# Altium footprint library SWARMUS_LIB.PcbLib: 114 footprints (part 3 of 8)
Each footprint in its own frame and in the unit in brackets; x right, y up, seen from the top. Pads: shape width x height; smd on the part's side, far side on the other; paste and mask are expansions set on the pad; w line width, h text height; cw(c..) or ccw(c..) is an arc to the next point about the centre after c.
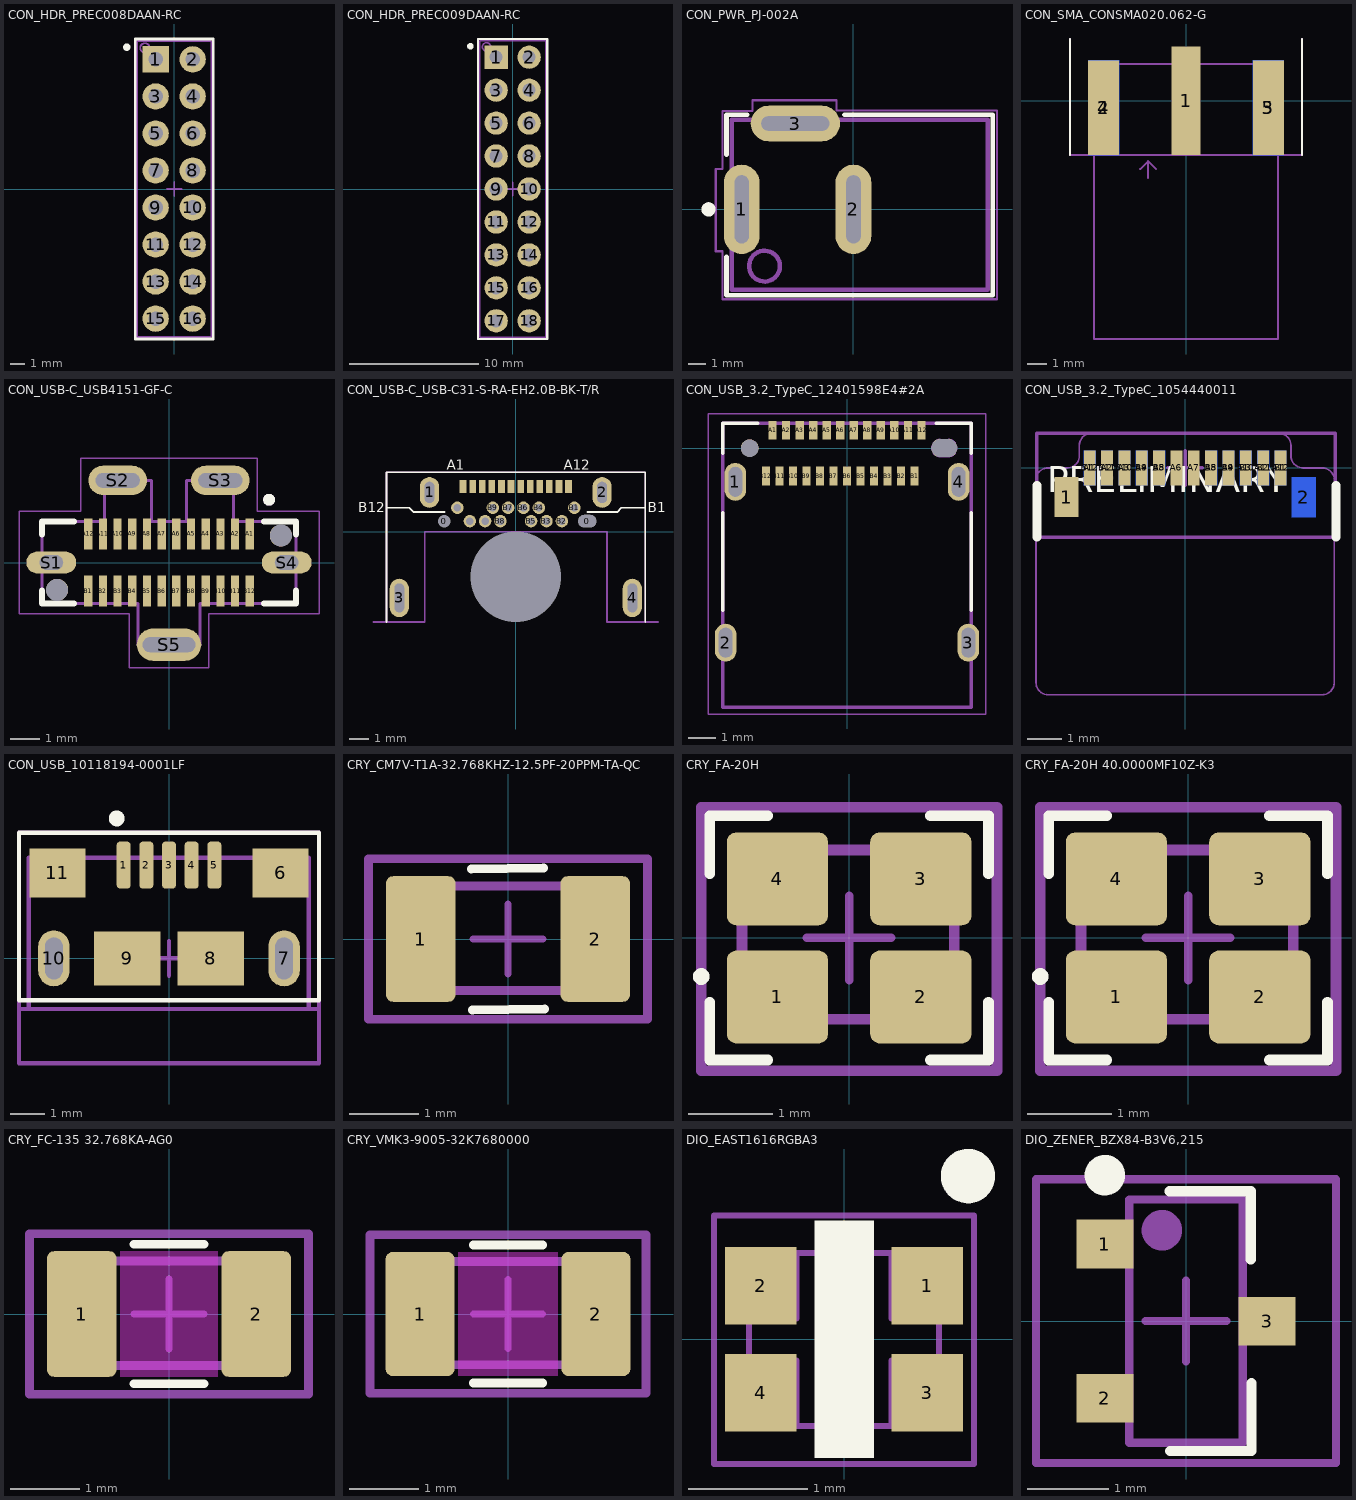
[diagram p2: the footprints below, top view; thin cyan lines are the x and y axes]

## CON_HDR_PREC008DAAN-RC [mm]
pads (16):
  rect 1.8x1.8 hole 1: 1(-1.27,8.89)
  round 1.8 hole 1: 2(1.27,8.89) 3(-1.27,6.35) 4(1.27,6.35) 5(-1.27,3.81) 6(1.27,3.81) 7(-1.27,1.27) 8(1.27,1.27) 9(-1.27,-1.27) 10(1.27,-1.27) 11(-1.27,-3.81) 12(1.27,-3.81) 13(-1.27,-6.35) 14(1.27,-6.35) 15(-1.27,-8.89) 16(1.27,-8.89)
Top Overlay:
  circle w0.25: c-3.251,9.728 r0.127
  lines w0.178: -2.667,-10.287 2.667,-10.287 2.667,10.287 -2.667,10.287 -2.667,-10.287
Top Assembly Drawing:
  circle w0.127: c-2.007,9.677 r0.322
  lines w0.127: -0.5,0 0.5,0 ; 0,-0.5 0,0.5 ; -2.54,-10.16 -2.54,10.16 2.54,10.16 2.54,-10.16 -2.54,-10.16
Top Courtyard:
  lines w0.127: -2.667,-10.287 -2.667,10.287 2.667,10.287 2.667,-10.287 -2.667,-10.287
3D body "PR(E,P)C008DAAN-RC.STEP": height 8.37, standoff -3, extent -2.54,-10.16 2.54,10.16

## CON_HDR_PREC009DAAN-RC [mm]
pads (18):
  rect 1.8x1.8 hole 1: 1(-1.27,10.16)
  round 1.8 hole 1: 2(1.27,10.16) 3(-1.27,7.62) 4(1.27,7.62) 5(-1.27,5.08) 6(1.27,5.08) 7(-1.27,2.54) 8(1.27,2.54) 9(-1.27,0) 10(1.27,0) 11(-1.27,-2.54) 12(1.27,-2.54) 13(-1.27,-5.08) 14(1.27,-5.08) 15(-1.27,-7.62) 16(1.27,-7.62) 17(-1.27,-10.16) 18(1.27,-10.16)
Top Overlay:
  circle w0.25: c-3.251,10.998 r0.127
  lines w0.178: -2.667,-11.557 -2.667,11.557 2.667,11.557 2.667,-11.557 -2.667,-11.557
Top Assembly Drawing:
  circle w0.127: c-2.007,10.947 r0.322
  lines w0.127: -0.5,0 0.5,0 ; 0,-0.5 0,0.5 ; -2.54,-11.43 2.54,-11.43 2.54,11.43 -2.54,11.43 -2.54,-11.43
Top Courtyard:
  lines w0.127: -2.667,-11.557 -2.667,11.557 2.667,11.557 2.667,-11.557 -2.667,-11.557
3D body "PREC009DAAN-RC.step": height 8.43, standoff -2.94, extent -2.54,-11.43 2.54,11.43

## CON_PWR_PJ-002A [mm]
pads (3):
  oval 2x5 hole 0.8 slot 3.8 at 90 deg mask+0.07: 1(-6.25,0) 2(0,0)
  oval 5x2 hole 0.8 slot 3.8 at 0 deg mask+0.07: 3(-3.25,4.8)
Top Overlay:
  circle w0.4: c-8.108,-0.002 r0.2
  lines w0.254: -7.1,-2.65 -7.1,-4.8 7.8,-4.8 7.8,5.3 -0.502,5.3 ; -7.1,3.043 -7.1,5.3 -5.929,5.3
Top Assembly Drawing:
  circle w0.254: c-4.975,-3.175 r0.862
  lines w0.254: -6.8,-4.5 -6.8,5 7.5,5 7.5,-4.5 -6.8,-4.5
Top Courtyard:
  lines w0.127: -0.9,0 0,0 ; 0,-0.9 0,0 ; 0,0.9 0,0 ; 0.9,0 0,0 ; -7.7,-2.35 -7.325,-2.35 -7.325,-5.025 8.025,-5.025 8.025,5.525 -0.95,5.525 -0.95,6.1 -5.65,6.1 -5.65,5.5 -7.325,5.5 -7.325,2.25 -7.7,2.25 -7.7,-2.35
3D body "54-00166.STEP": height 11.02, standoff -3.58, extent -6.8,-4.5 7.5,5

## CON_SMA_CONSMA020.062-G [mm] "EDGE SMA femal connector"
pads (5):
  rect 1.5x5.6 smd paste-25 mask+0.07: 1(0,0)
  rect 1.6x4.9 smd paste-25 mask+0.07: 2(-4.26,-0.35) 3(4.26,-0.35)
  rect 1.6x4.9 smd far side paste-25 mask+0.07: 4(-4.26,-0.35) 5(4.26,-0.35)
Top Overlay:
  lines w0.1: -6,-2.8 -6,3.2 ; 6,-2.8 6,3.2
Bottom Overlay:
  lines w0.1: -6,-2.8 -6,3.2 ; 6,-2.8 6,3.2
Top Assembly Drawing:
  lines w0.1: -2.37,-3.52 -1.959,-3.109 ; -1.959,-3.994 -1.959,-3.109 ; -1.548,-3.52 -1.959,-3.109 ; -4.76,-2.8 4.76,-2.8 ; -4.76,-2.8 -4.76,-12.3 4.76,-12.3 4.76,-2.8 ; -4.76,-2.8 -4.76,1.9 4.76,1.9 4.76,-2.8
  text "Board edge / 62 mils PCB" at -4.185,-6.655 h0.8
Top Courtyard:
  lines w0.1: -6,3.2 -6,-2.8 6,-2.8 6,3.2 ; -0.5,0 0.5,0 ; 0,-0.5 0,0.5
Bottom Courtyard:
  lines w0.1: -6,3.2 -6,-2.8 6,-2.8 6,3.2
3D body "CONSMA020.062-G--3DModel-STEP-56544.STEP": height 4.35, standoff -3.57, extent -4.76,-12.3 4.76,1.9

## CON_USB-C_USB4151-GF-C [mm] "USB-C plug Vertical"
pads (31):
  rect 0.28x1.05 smd mask+0.045: A1(2.75,0.975) A2(2.25,0.975) A3(1.75,0.975) A4(1.25,0.975) A5(0.75,0.975) A6(0.25,0.975) A7(-0.25,0.975) A8(-0.75,0.975) A9(-1.25,0.975) A10(-1.75,0.975) A11(-2.25,0.975) A12(-2.75,0.975) B1(-2.75,-0.975) B2(-2.25,-0.975) B3(-1.75,-0.975) B4(-1.25,-0.975) B5(-0.75,-0.975) B6(-0.25,-0.975) B7(0.25,-0.975) B8(0.75,-0.975) B9(1.25,-0.975) B10(1.75,-0.975) B11(2.25,-0.975) B12(2.75,-0.975)
  oval 1.7x0.75 hole 0.5 slot 0.8 at 0 deg mask+0.05: S1(-4.01,0) S4(4.01,0)
  oval 2x1 hole 0.5 slot 1.5 at 0 deg mask+0.05: S2(-1.75,2.8) S3(1.75,2.8)
  oval 2.2x1.1 hole 0.5 slot 1.8 at 0 deg mask+0.05: S5(0,-2.8)
  round 0.75 hole 0.75 unplated mask+0: ""(-3.81,-0.93) ""(3.81,0.92)
Top Overlay:
  circle w0.2: c3.41,2.14 r0.1
  lines w0.2: -4.33,-0.95 -4.33,-1.4 -3.24,-1.4 ; -4.33,0.95 -4.33,1.4 -3.24,1.4 ; 3.24,-1.4 4.33,-1.4 4.33,-0.95 ; 3.24,1.4 4.33,1.4 4.33,0.95
Top 3D Model:
  circle w0.2: c3.41,2.14 r0.1
  lines w0.1: -4.33,-1.4 -4.33,1.4 -2.2,1.4 -2.2,2.8 -0.6,2.8 -0.6,1.4 0.6,1.4 0.6,2.8 2.2,2.8 2.2,1.4 4.33,1.4 4.33,-1.4 1.05,-1.4 1.05,-2.8 -1.05,-2.8 -1.05,-1.4 -4.33,-1.4
Top Courtyard:
  lines w0.05: -5.11,-1.75 -5.11,1.75 -3,1.75 -3,3.55 3,3.55 3,1.75 5.11,1.75 5.11,-1.75 1.35,-1.75 1.35,-3.58 -1.35,-3.58 -1.35,-1.75 -5.11,-1.75
3D body "USB4151-GF-C--3DModel-STEP-56544.STEP": height 11.1, standoff -1.25, extent -4.33,-2.875 4.33,2.875

## CON_USB-C_USB-C31-S-RA-EH2.0B-BK-T/R [mm] "USB-C 24 pins"
pads (31):
  round 0.6 hole 0.65 unplated mask+0: 0(-3.725,0.55)
  rect 0.35x0.7 hole 4.7 square unplated: 0(0,-2.35)
  round 0.6 hole 0.65 slot 0.95 at 0 deg unplated mask+0: 0(3.725,0.55)
  oval 1x1.6 hole 1.1 slot 0.5 at 0 deg: 1(-4.5,2.05) 2(4.5,2.05)
  oval 1x2 hole 1.5 slot 0.5 at 0 deg: 3(-6.075,-3.45) 4(6.075,-3.45)
  rect 0.35x0.7 smd mask+0: A1(-2.75,2.36) A2(-2.25,2.36) A3(-1.75,2.36) A4(-1.25,2.36) A5(-0.75,2.36) A6(-0.25,2.36) A7(0.25,2.36) A8(0.75,2.36) A9(1.25,2.36) A10(1.75,2.36) A11(2.25,2.36) A12(2.75,2.36)
  round 0.65 hole 0.4 mask+0: B1(3.05,1.25) B2(2.4,0.55) B3(1.6,0.55) B4(1.2,1.25) B5(0.8,0.55) B6(0.4,1.25) B7(-0.4,1.25) B8(-0.8,0.55) B9(-1.2,1.25) B10(-1.6,0.55) B11(-2.4,0.55) B12(-3.05,1.25)
Top Overlay:
  lines w0.1: -6.75,-4.7 -6.75,3.1 6.75,3.1 6.75,-4.7 ; -6.75,1.25 -5.547,1.25 -5.324,1.027 -3.725,1.027 ; 3.725,1.027 5.282,1.027 5.505,1.25 6.75,1.25
  text "B1" at 6.886,1.013 h0.51
  text "B12" at -8.229,1.027 h0.51
  text "A12" at 2.502,3.227 h0.51
  text "A1" at -3.598,3.227 h0.51
Bottom Overlay:
  text "B12" at -2.73,1.807 h0.51
  text "B1" at 3.37,1.807 h0.51
Board Outline:
  lines w0.1: -7.414,-4.7 -4.75,-4.7 -4.75,0 4.75,0 4.75,-4.7 7.414,-4.7
  text "Board edge" at -7.16,-6.581 h1.52
Top Courtyard:
  lines w0.1: -6.75,-4.7 -6.75,3.1 6.75,3.1 6.75,-4.7
3D body "USB-C31-S-RA-EH2.0B-BK-TR.STEP": height 2, standoff -1.42, extent -6.175,-5.85 6.175,2.8

## CON_USB_3.2_TypeC_12401598E4#2A [mm]
pads (30):
  oval 0.8x1.4 hole 0.5 slot 1.1 at 90 deg paste+0 mask+0.07: 1(-4.13,-1.25) 2(-4.49,-7.2) 3(4.49,-7.2) 4(4.13,-1.25)
  rect 0.3x0.7 smd paste-0.025 mask+0.04: A1(-2.75,0.66) A2(-2.25,0.66) A3(-1.75,0.66) A4(-1.25,0.66) A5(-0.75,0.66) A6(-0.25,0.66) A7(0.25,0.66) A8(0.75,0.66) A9(1.25,0.66) A10(1.75,0.66) A11(2.25,0.66) A12(2.75,0.66) B1(2.5,-1.04) B2(2,-1.04) B3(1.5,-1.04) B4(1,-1.04) B5(0.5,-1.04) B6(0,-1.04) B7(-0.5,-1.04) B8(-1,-1.04) B9(-1.5,-1.04) B10(-2,-1.04) B11(-2.5,-1.04) B12(-3,-1.04)
  round 0.65 hole 0.65 unplated mask+0.07: ""(-3.6,0)
  oval 0.95x0.65 hole 0.65 slot 0.95 at 0 deg paste+0 mask+0.07: ""(3.6,0)
Top Overlay:
  lines w0.127: -4.6,-6 -4.6,-2.4 ; -4.6,-0.2 -4.6,0.91 -3.3,0.91 ; 3.3,0.91 4.6,0.91 4.6,-0.2 ; 4.6,-6 4.6,-2.4
Top Assembly Drawing:
  lines w0: 3.45,-0.325 cw(c3.45,0) 3.45,0.325 3.75,0.325 cw(c3.75,0) 3.75,-0.325 3.45,-0.325
  lines w0.127: -4.6,0.889 -4.6,-9.59 4.6,-9.59 4.6,0.91 -4.6,0.91
  text "A12" at 2.921,0.127 h0.51
  text "B1" at 3.048,-2.285 h0.51
  text "B12" at -4.17,-2.168 h0.51
  text "A1" at -4.064,0.127 h0.51
Top Courtyard:
  lines w0.05: -5.14,-9.84 5.14,-9.84 5.14,1.26 -5.14,1.26 -5.14,-9.84
3D body "12401598E4#2A--3DModel-STEP-56544.STEP": height 3.28, standoff -2.1, extent -4.6,-9.6 4.6,0.9

## CON_USB_3.2_TypeC_1054440011 [mm] "USB-C plug, sandwhich 0.8mm board"
pads (24):
  rect 0.7x1.15 smd: 1(-3.42,-0.84)
  rect 0.7x1.15 smd far side: 2(3.42,-0.84)
  rect 0.34x1 smd mask+0.02: A1(-2.75,0) A2(-2.25,0) A3(-1.75,0) A4(-1.25,0) A5(-0.75,0) A6(-0.25,0) A7(0.25,0) A8(0.75,0) A9(1.25,0) A10(1.75,0) A11(2.25,0) A12(2.75,0)
  rect 0.34x1 smd far side mask+0.02: B1(2.75,0) B2(2.25,0) B3(1.75,0) B4(1.25,0) B5(0.75,0) B8(-0.75,0) B9(-1.25,0) B10(-1.75,0) B11(-2.25,0) B12(-2.75,0)
Top Overlay:
  lines w0.254: -4.275,-2 -4.275,-0.5 ; 4.35,-2 4.35,-0.5
  text "PRELIMINARY" at -3.975,-0.7 h0.76
Top Assembly Drawing:
  lines w0.05: -4.3,-6.19 ccw(c-3.95,-6.19) -3.95,-6.54 3.95,-6.54 ccw(c3.95,-6.19) 4.3,-6.19 4.3,-0.35 ccw(c3.95,-0.35) 3.95,0 3.4,0 cw(c3.4,0.35) 3.05,0.35 3.05,0.65 ccw(c2.7,0.65) 2.7,1 -2.7,1 ccw(c-2.7,0.65) -3.05,0.65 -3.05,0.35 cw(c-3.4,0.35) -3.4,0 -3.95,0 ccw(c-3.95,-0.35) -4.3,-0.35 -4.3,-6.19
Top Courtyard:
  lines w0.1: -0.5,0 0.5,0 ; 0,-0.5 0,0.5 ; 4.325,-2 -4.275,-2 -4.275,1 4.325,1 4.325,-1.925
3D body "1054440011.stp": height 1.72, standoff -2.12, extent -4.59,-0.99 4.59,11.05

## CON_USB_10118194-0001LF [mm] "CONN USB MICRO B RECPT SMT R/A"
height 2.4
pads (11):
  rrect50% 0.4x1.35 smd paste-0.05 mask+0.05: 1(-1.3,2.675) 2(-0.65,2.675) 3(0,2.675) 4(0.65,2.675) 5(1.3,2.675)
  rect 1.6x1.4 smd paste-0.05 mask+0.05: 6(3.2,2.45) 11(-3.2,2.45)
  rrect100% 0.9x1.6 hole 0.5 slot 1.2 at 90 deg mask+0.05: 7(3.3,0) 10(-3.3,0)
  rect 1.9x1.55 smd paste-0.05 mask+0.05: 8(1.2,0) 9(-1.2,0)
Top Overlay:
  circle w0.254: c-1.499,4.013 r0.1
  lines w0.127: -4.3,-1.2 -4.3,3.6 4.3,3.6 4.3,2.55 4.3,0.05 4.3,-1.2 -4.3,-1.2
Top Assembly Drawing:
  lines w0.127: -4.3,-1.45 -4.025,-1.45 ; 4.025,-1.45 4.3,-1.45 ; -4.025,-1.45 -4.025,2.89 4,2.89 4,-1.45 -4,-1.45 -4.025,-1.45
  text "Board Edge" at -2.9,-2.4 h0.6
Top Courtyard:
  lines w0.127: -0.5,0 0,0 ; 0,-0.5 0,0 ; 0,0.5 0,0 ; 0.5,0 0,0 ; -4.3,-3 -4.3,3.6 4.3,3.6 4.3,-3 -4.3,-3
3D body "10118193-0001lfc.stp": height 2.88, standoff -0.72, extent -3.928,-2.76 3.929,2.9

## CRY_CM7V-T1A-32.768KHZ-12.5PF-20PPM-TA-QC [mm] "CRY - 32.768KHZ tol:20ppm 12.5PF - 2-SMD"
height 0.65
pads (2):
  rrect20% 1x1.8 smd paste-0.025 mask+0.07: 1(-1.25,0) 2(1.25,0)
Top Overlay:
  lines w0.127: -0.527,1.005 0.508,1.016 ; -0.508,-1.016 0.527,-1.005
Top Assembly Drawing:
  lines w0.127: -1.6,0.762 1.6,0.762 1.6,-0.738 ; -1.6,0.763 -1.6,-0.737 1.6,-0.737
Top Assembly:
  lines w0.1: -1.65,-0.8 -1.65,0.8 ; 1.65,-0.8 1.65,0.8
Top Courtyard:
  lines w0.1: -0.5,0 0.5,0 ; 0,-0.5 0,0.5
  lines w0.127: -2,-1.15 2,-1.15 2,1.15 -2,1.15 -2,-1.15 ; -2,-1.15 -2,-1.15
3D body: height 0.65, standoff 0, extent -0.6,-0.8 0.6,0.8
3D body: height 0.65, standoff 0, extent -1.65,-0.8 -0.6,0.8
3D body: height 0.65, standoff 0, extent 0.6,-0.8 1.65,0.8

## CRY_FA-20H [mm] "CRY - FA-20H 4-SMD"
height 0.55
pads (4):
  rrect20% 1.2x1.1 smd paste-0.025 mask+0.07: 1(-0.85,-0.7) 2(0.85,-0.7) 3(0.85,0.7) 4(-0.85,0.7)
Top Overlay:
  circle w0.1: c-1.753,-0.457 r0.05
  lines w0.127: -1.651,-0.762 -1.651,-1.448 -0.965,-1.448 ; -1.651,0.762 -1.651,1.448 -0.965,1.448 ; 0.965,-1.448 1.651,-1.448 1.651,-0.762 ; 0.965,1.448 1.651,1.448 1.651,0.762
Top Assembly Drawing:
  circle w0.254: c-0.85,-0.457 r0.036
  lines w0.127: -1.27,1.035 -1.27,-0.965 1.23,-0.965 ; -1.255,1.041 1.245,1.041 1.245,-0.959
Top Courtyard:
  lines w0.1: -0.5,0 0.5,0 ; 0,-0.5 0,0.5
  lines w0.127: -1.753,-1.575 -1.753,1.549 1.753,1.549 1.753,-1.575 -1.753,-1.575
3D body: height 0.55, standoff 0.05, extent -1.3,-1.05 1.3,1.05

## CRY_FA-20H 40.0000MF10Z-K3 [mm] "CRY - 40MKHZ 10ppm 10PF - 4-SMD"
height 0.55
pads (4):
  rrect20% 1.2x1.1 smd paste-0.025 mask+0.07: 1(-0.85,-0.7) 2(0.85,-0.7) 3(0.85,0.7) 4(-0.85,0.7)
Top Overlay:
  circle w0.1: c-1.753,-0.457 r0.05
  lines w0.127: -1.651,-0.762 -1.651,-1.448 -0.965,-1.448 ; -1.651,0.762 -1.651,1.448 -0.965,1.448 ; 0.965,-1.448 1.651,-1.448 1.651,-0.762 ; 0.965,1.448 1.651,1.448 1.651,0.762
Top Assembly Drawing:
  circle w0.254: c-0.85,-0.457 r0.036
  lines w0.127: -1.27,1.035 -1.27,-0.965 1.23,-0.965 ; -1.255,1.041 1.245,1.041 1.245,-0.959
Top Courtyard:
  lines w0.1: -0.5,0 0.5,0 ; 0,-0.5 0,0.5
  lines w0.127: -1.753,-1.575 -1.753,1.549 1.753,1.549 1.753,-1.575 -1.753,-1.575
3D body: height 0.55, standoff 0.05, extent -1.3,-1.05 1.3,1.05

## CRY_FC-135 32.768KA-AG0 [mm] "CRY - 32.768KHZ tol:20ppm 12.5PF - 2-SMD"
height 0.65
pads (2):
  rrect20% 1x1.8 smd paste-0.025 mask+0.07: 1(-1.25,0) 2(1.25,0)
Top Layer keep-out:
  rectangle: -0.7,-0.9 0.7,0.9
Top Overlay:
  lines w0.127: -0.5,-1 0.5,-1 ; -0.5,1 0.5,1
Top Assembly Drawing:
  lines w0.127: -1.6,0.762 1.6,0.762 1.6,-0.738 ; -1.6,0.763 -1.6,-0.737 1.6,-0.737
Top Assembly:
  lines w0.1: -1.65,-0.8 -1.65,0.8 ; 1.65,-0.8 1.65,0.8
Top Courtyard:
  lines w0.1: -0.5,0 0.5,0 ; 0,-0.5 0,0.5
  lines w0.127: -2,-1.15 -2,-1.15 ; -2,-1.15 -2,1.15 2,1.15 2,-1.15 -2,-1.15
3D body: height 0.65, standoff 0, extent 0.6,-0.8 1.65,0.8
3D body: height 0.65, standoff 0, extent -1.65,-0.8 -0.6,0.8
3D body: height 0.65, standoff 0, extent -0.6,-0.8 0.6,0.8

## CRY_VMK3-9005-32K7680000 [mm] "CRY - 32.768KHZ tol:20ppm 9PF - 2-SMD"
height 0.65
pads (2):
  rrect20% 1x1.8 smd paste-0.025 mask+0.07: 1(-1.275,0) 2(1.275,0)
Top Layer keep-out:
  rectangle: -0.725,-0.9 0.725,0.9
Top Overlay:
  lines w0.127: -0.5,-1 0.5,-1 ; -0.5,1 0.5,1
Top Assembly Drawing:
  lines w0.127: -1.6,0.762 1.6,0.762 1.6,-0.738 ; -1.6,0.763 -1.6,-0.737 1.6,-0.737
Top Assembly:
  lines w0.1: -1.65,-0.8 -1.65,0.8 ; 1.65,-0.8 1.65,0.8
Top Courtyard:
  lines w0.1: -0.5,0 0.5,0 ; 0,-0.5 0,0.5
  lines w0.127: -2,-1.15 -2,-1.15 ; -2,-1.15 -2,1.15 2,1.15 2,-1.15 -2,-1.15
3D body: height 0.65, standoff 0, extent 0.6,-0.8 1.65,0.8
3D body: height 0.65, standoff 0, extent -1.65,-0.8 -0.6,0.8
3D body: height 0.65, standoff 0, extent -0.6,-0.8 0.6,0.8

## DIO_EAST1616RGBA3 [mm] "Diode Red/Green/Blue"
height 0.45
pads (4):
  rect 0.6x0.65 smd paste-0.025 mask+0.05: 1(0.7,0.45) 2(-0.7,0.45) 3(0.7,-0.45) 4(-0.7,-0.45)
Top Overlay:
  circle w0.254: c1.041,1.372 r0.102
  rectangle: -0.25,-1 0.25,1
Top Assembly Drawing:
  lines w0.05: -0.8,-0.179 -0.8,0.175 ; 0.799,0.172 0.799,-0.18 ; -0.8,0.175 -0.8,0.325 ccw(c-0.8,0.45) -0.8,0.575 -0.8,0.725 -0.4,0.725 ; -0.8,0.175 -0.4,0.175 -0.4,0.725 ; -0.401,-0.73 -0.401,-0.18 -0.801,-0.18 -0.801,-0.33 cw(c-0.801,-0.455) -0.801,-0.58 -0.801,-0.73 -0.401,-0.73 ; -0.401,-0.73 0.399,-0.73 ; -0.4,0.725 0.4,0.725 ; 0.399,-0.73 0.399,-0.18 0.799,-0.18 ; 0.399,-0.73 0.799,-0.73 0.799,-0.58 cw(c0.799,-0.455) 0.799,-0.33 0.799,-0.18 ; 0.4,0.725 0.4,0.175 0.8,0.175 0.8,0.325 cw(c0.8,0.45) 0.8,0.575 0.8,0.725 0.4,0.725
Top Courtyard:
  lines w0.05: -1.094,-1.049 1.092,-1.049 1.092,1.041 -1.094,1.041 -1.094,-1.049
3D body "EAST1616RGBA0.STEP": height 0.46, standoff -0.05, extent -0.8,-0.8 0.8,0.8

## DIO_ZENER_BZX84-B3V6,215 [mm]
height 1.1
pads (3):
  rect 0.7x0.6 smd paste-0.025 mask+0.07: 1(-1,0.95) 2(-1,-0.95) 3(1,0)
Top Overlay:
  circle w0.25: c-1,1.8 r0.125
  lines w0.127: -0.2,1.6 0.8,1.6 0.8,0.764 ; -0.193,-1.602 0.807,-1.602 0.807,-0.765
Top Assembly Drawing:
  circle w0.25: c-0.297,1.12 r0.125
  lines w0.1: -0.7,-1.5 -0.7,1.5 0.7,1.5 0.7,-1.5 -0.7,-1.5
Top Courtyard:
  lines w0.1: -0.5,0 0.5,0 ; 0,-0.5 0,0.5 ; -1.85,-1.75 -1.85,1.75 1.85,1.75 1.85,-1.75 -1.85,-1.75
3D body "SOT95P230X110-3N.step": height 1.1, standoff 0, extent -1.3,-1.5 1.3,1.5